# Altium footprint library 1.20-电感.PcbLib: 72 footprints (part 2 of 5)
Each footprint in its own frame and in the unit in brackets; x right, y up, seen from the top. Pads: shape width x height; smd on the part's side, far side on the other; paste and mask are expansions set on the pad; w line width, h text height; cw(c..) or ccw(c..) is an arc to the next point about the centre after c.
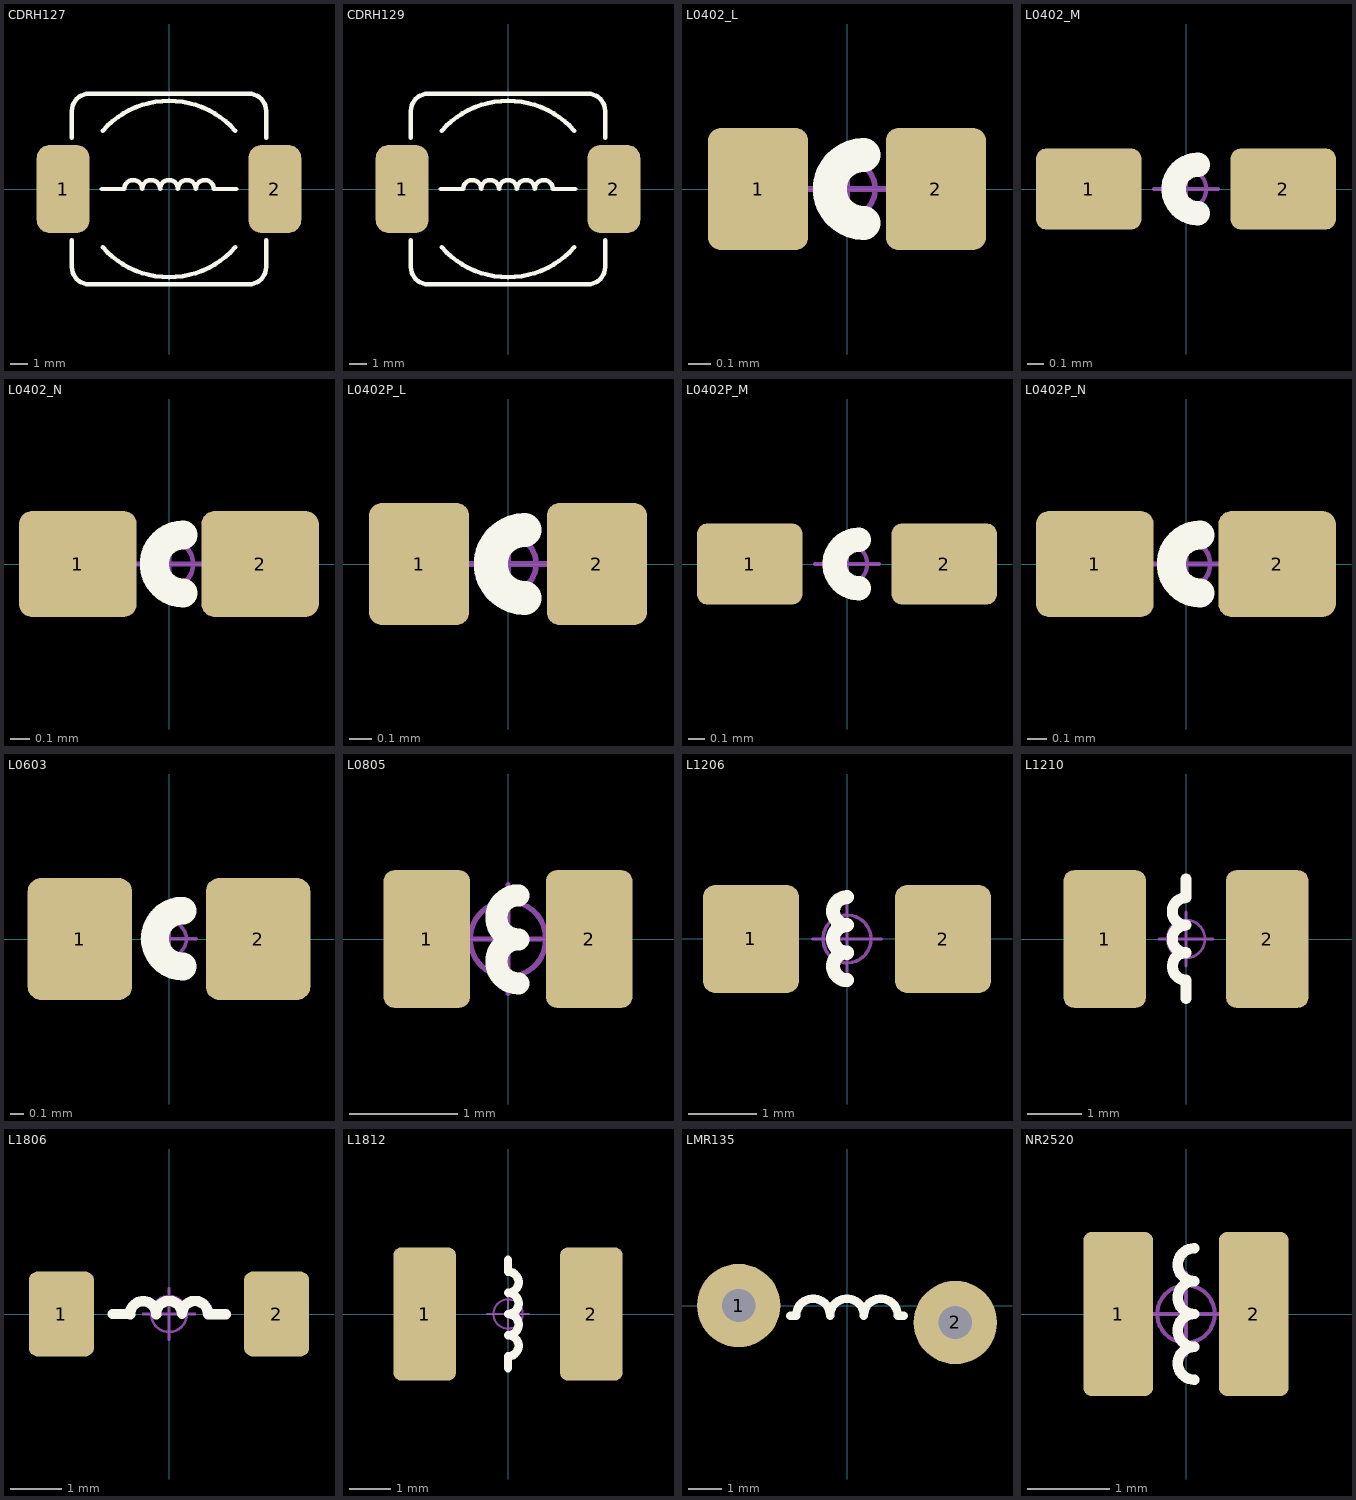
[diagram p1: the footprints below, top view; thin cyan lines are the x and y axes]

## CDRH127 [mm] "12*12*8mm（长宽高）"
pads (2):
  rrect50% 3x5 smd: 1(-6,0) 2(6,0)
Top Overlay:
  lines w0.254: -5.5,-2.9 -5.5,-4.43 ccw(c-4.53,-4.43) -4.53,-5.4 4.53,-5.4 ccw(c4.53,-4.43) 5.5,-4.43 5.5,-2.9 ; -5.5,2.9 -5.5,4.43 cw(c-4.53,4.43) -4.53,5.4 4.53,5.4 cw(c4.53,4.43) 5.5,4.43 5.5,2.9 ; -3.81,0 -2.54,0 cw(c-2.032,0) -1.524,0 cw(c-1.016,0) -0.508,0 cw(c0,0) 0.508,0 cw(c1.016,0) 1.524,0 cw(c2.032,0) 2.54,0 3.81,0 ; -3.763,-3.293 ccw(c0,0) 3.763,-3.293 ; -3.763,3.293 cw(c0,0) 3.763,3.293
3D body "CDRH127.STEP": height 7.8, standoff 0, extent -6,-6 6,6

## CDRH129 [mm] "12*12*9.5mm（长宽高）"
pads (2):
  rrect50% 3x5 smd: 1(-6,0) 2(6,0)
Top Overlay:
  lines w0.254: -5.5,-2.9 -5.5,-4.43 ccw(c-4.53,-4.43) -4.53,-5.4 4.53,-5.4 ccw(c4.53,-4.43) 5.5,-4.43 5.5,-2.9 ; -5.5,2.9 -5.5,4.43 cw(c-4.53,4.43) -4.53,5.4 4.53,5.4 cw(c4.53,4.43) 5.5,4.43 5.5,2.9 ; -3.81,0 -2.54,0 cw(c-2.032,0) -1.524,0 cw(c-1.016,0) -0.508,0 cw(c0,0) 0.508,0 cw(c1.016,0) 1.524,0 cw(c2.032,0) 2.54,0 3.81,0 ; -3.763,-3.293 ccw(c0,0) 3.763,-3.293 ; -3.763,3.293 cw(c0,0) 3.763,3.293
3D body "CDRH127.STEP": height 7.8, standoff 0, extent -6,-6 6,6

## L0402_L [mm] "小功率贴片电感"
pads (2):
  rrect25% 0.45x0.55 smd: 1(-0.4,0) 2(0.4,0)
Top Overlay:
  lines w0.152: 0.075,-0.152 cw(c0.075,0) 0.075,0.152
Mechanical 15:
  circle w0.025: c0,0 r0.127
  lines w0.025: -0.2,0 0.2,0 ; 0,-0.2 0,0.2
3D body "0402.STEP": height 0.53, standoff 0.03, extent -0.5,-0.25 0.5,0.25

## L0402_M [mil] "小功率贴片电感"
pads (2):
  rrect25% 26x20 smd: 1(-24,0) 2(24,0)
Top Overlay:
  lines w6: 2.94,-6 cw(c2.94,0) 2.94,6
Mechanical 15:
  circle w1: c0,0 r5
  lines w1: -7.87,0 7.87,0 ; 0,-7.87 0,7.87
3D body "0402.STEP": height 20.68, standoff 1, extent -19.68,-9.84 19.69,9.85

## L0402_N [mm] "小功率贴片电感"
pads (2):
  rrect25% 0.62x0.56 smd: 1(-0.48,0)
  rrect26% 0.62x0.56 smd: 2(0.48,0)
Top Overlay:
  lines w0.152: 0.075,-0.152 cw(c0.075,0) 0.075,0.152
Mechanical 15:
  circle w0.025: c0,0 r0.127
  lines w0.025: -0.2,0 0.2,0 ; 0,-0.2 0,0.2
3D body "0402.STEP": height 0.53, standoff 0.03, extent -0.5,-0.25 0.5,0.25

## L0402P_L [mm] "小型功率电感"
pads (2):
  rrect25% 0.45x0.55 smd: 1(-0.4,0) 2(0.4,0)
Top Overlay:
  lines w0.152: 0.075,-0.152 cw(c0.075,0) 0.075,0.152
Mechanical 15:
  circle w0.025: c0,0 r0.127
  lines w0.025: -0.2,0 0.2,0 ; 0,-0.2 0,0.2
3D body "IND_MURATA_LQW15AN.step": height 0.51, standoff 0, extent -0.5,-0.3 0.5,0.3

## L0402P_M [mil] "小型功率电感"
pads (2):
  rrect25% 26x20 smd: 1(-24,0) 2(24,0)
Top Overlay:
  lines w6: 2.94,-6 cw(c2.94,0) 2.94,6
Mechanical 15:
  circle w1: c0,0 r5
  lines w1: -7.87,0 7.87,0 ; 0,-7.87 0,7.87
3D body "IND_MURATA_LQW15AN.step": height 20.08, standoff 0, extent -19.68,-11.8 19.69,11.82

## L0402P_N [mm] "小型功率电感"
pads (2):
  rrect25% 0.62x0.56 smd: 1(-0.48,0)
  rrect26% 0.62x0.56 smd: 2(0.48,0)
Top Overlay:
  lines w0.152: 0.075,-0.152 cw(c0.075,0) 0.075,0.152
Mechanical 15:
  circle w0.025: c0,0 r0.127
  lines w0.025: -0.2,0 0.2,0 ; 0,-0.2 0,0.2
3D body "IND_MURATA_LQW15AN.step": height 0.51, standoff 0, extent -0.5,-0.3 0.5,0.3

## L0603 [mil] "小功率贴片电感"
pads (2):
  rrect25% 30x35 smd: 1(-25.59,0) 2(25.59,0)
Top Overlay:
  lines w8: 3.94,-7.87 cw(c3.94,0.13) 3.94,8.13
Mechanical 15:
  circle w1: c0,0 r5
  lines w1: -7.87,0 7.88,0 ; 0,-7.87 0,7.88
3D body "l0603.STEP": height 32.5, standoff 1, extent -31.49,-15.74 31.5,15.75

## L0805 [mm] "小功率贴片电感                              淘宝ID:黄晶宝石"
height 0.5
pads (2):
  rrect25% 0.8x1.27 smd: 1(-0.75,0) 2(0.75,0)
Top Overlay:
  lines w0.203: 0.096,-0.41 cw(c0.096,-0.207) 0.096,-0.004 cw(c0.096,0.199) 0.096,0.403
Mechanical 15:
  circle w0.05: c0,0 r0.35
  circle w0.05: c0,0 r0.35
  lines w0.05: -0.5,0 0.5,0 -0.5,0 ; 0,-0.5 0,0.5 0,-0.5
3D body "l0805.STEP": height 0.93, standoff 0.03, extent -1,-0.6 1,0.6

## L1206 [mil] "小功率贴片电感                              淘宝ID:黄晶宝石"
pads (2):
  rrect25% 55x62 smd: 1(-55.12,0) 2(55.11,0)
Top Overlay:
  lines w8: 0,-23.62 cw(c0,-15.62) 0,-7.62 ; 0,-8 cw(c0,0) 0,8 cw(c0,16) 0,24
Mechanical 15:
  circle w1.97: c0,0 r13.78
  lines w1.97: -19.68,0 19.68,0 ; 0,-19.68 0,19.68
3D body "1206.STEP": height 36.43, standoff 1, extent -62.99,-31.49 63,31.5

## L1210 [mm] "小功率贴片电感                              淘宝ID:黄晶宝石"
pads (2):
  rrect25% 1.524x2.54 smd: 1(-1.5,0) 2(1.5,0)
Top Overlay:
  lines w0.203: 0,-1.1 0,-0.758 ; 0,-0.254 cw(c0,0) 0,0.254 cw(c0,0.508) 0,0.762 ; 0.002,-0.758 cw(c0.002,-0.504) 0.002,-0.25 ; 0.002,0.762 0.002,1.104
Mechanical 15:
  circle w0.05: c0,0 r0.35
  lines w0.05: -0.5,0 0.5,0 ; 0,-0.5 0,0.5
3D body "1210.STEP": height 1.33, standoff 0.03, extent -1.6,-1.25 1.6,1.25

## L1806 [mm] "小功率贴片电感                              淘宝ID:黄晶宝石"
pads (2):
  rrect25% 1.27x1.651 smd: 1(-2.1,0) 2(2.1,0)
Top Overlay:
  lines w0.203: -1.1,0 -0.758,0 ; -0.758,-0.002 cw(c-0.504,-0.002) -0.25,-0.002 ; -0.254,0 cw(c0,0) 0.254,0 cw(c0.508,0) 0.762,0 ; 0.762,-0.002 1.104,-0.002
Mechanical 15:
  circle w0.05: c0,0 r0.35
  lines w0.05: -0.5,0 0.5,0 ; 0,-0.5 0,0.5
3D body "1806.STEP": height 1.63, standoff 0.03, extent -2.25,-0.8 2.25,0.8

## L1812 [mm] "小功率贴片电感                               淘宝ID:黄晶宝石"
pads (2):
  rrect25% 1.5x3.2 smd: 1(-2,0) 2(2,0)
Top Overlay:
  lines w0.203: 0,-1.3 0,-1.016 ccw(c0,-0.762) 0,-0.508 ccw(c0,-0.254) 0,0 ccw(c0,0.254) 0,0.508 ccw(c0,0.762) 0,1.016 0,1.3
Mechanical 15:
  circle w0.05: c0,0 r0.35
  lines w0.05: -0.5,0 0.5,0 ; 0,-0.5 0,0.5
3D body "1812.STEP": height 1.53, standoff 0.03, extent -2.25,-1.6 2.25,1.6

## LMR135 [mm] "磁环电感，外径13mm，厚度5mm"
pads (2):
  round 2.5 hole 1: 1(-3.25,0) 2(3.25,-0.508)
Top Overlay:
  lines w0.254: -1.7,-0.3 -1.524,-0.3 cw(c-1.016,-0.3) -0.508,-0.3 cw(c0,-0.3) 0.508,-0.3 cw(c1.016,-0.3) 1.524,-0.3 1.7,-0.3
3D body "lmr135_asm.STEP": height 12.75, standoff -3.26, extent -3.401,-6.602 3.6,6.4

## NR2520 [mm] "2.5mm*2.0mm*1.0mm(长*宽*高）"
pads (2):
  rrect25% 0.85x2 smd: 1(-0.825,0) 2(0.825,0)
Top Overlay:
  lines w0.127: 0.1,-0.8 cw(c0.1,-0.6) 0.1,-0.4 cw(c0.1,-0.2) 0.1,0 cw(c0.1,0.2) 0.1,0.4 cw(c0.1,0.6) 0.1,0.8
Mechanical 15:
  circle w0.05: c0,0 r0.35
  lines w0.05: -0.5,0 0.5,0 ; 0,-0.5 0,0.5
3D body "NR2520.STEP": height 1.12, standoff 0.02, extent -1.25,-1 1.25,1